# Altium footprint library B-NT_CONNECT.PcbLib: 109 footprints (part 2 of 7)
Each footprint in its own frame and in the unit in brackets; x right, y up, seen from the top. Pads: shape width x height; smd on the part's side, far side on the other; paste and mask are expansions set on the pad; w line width, h text height; cw(c..) or ccw(c..) is an arc to the next point about the centre after c.
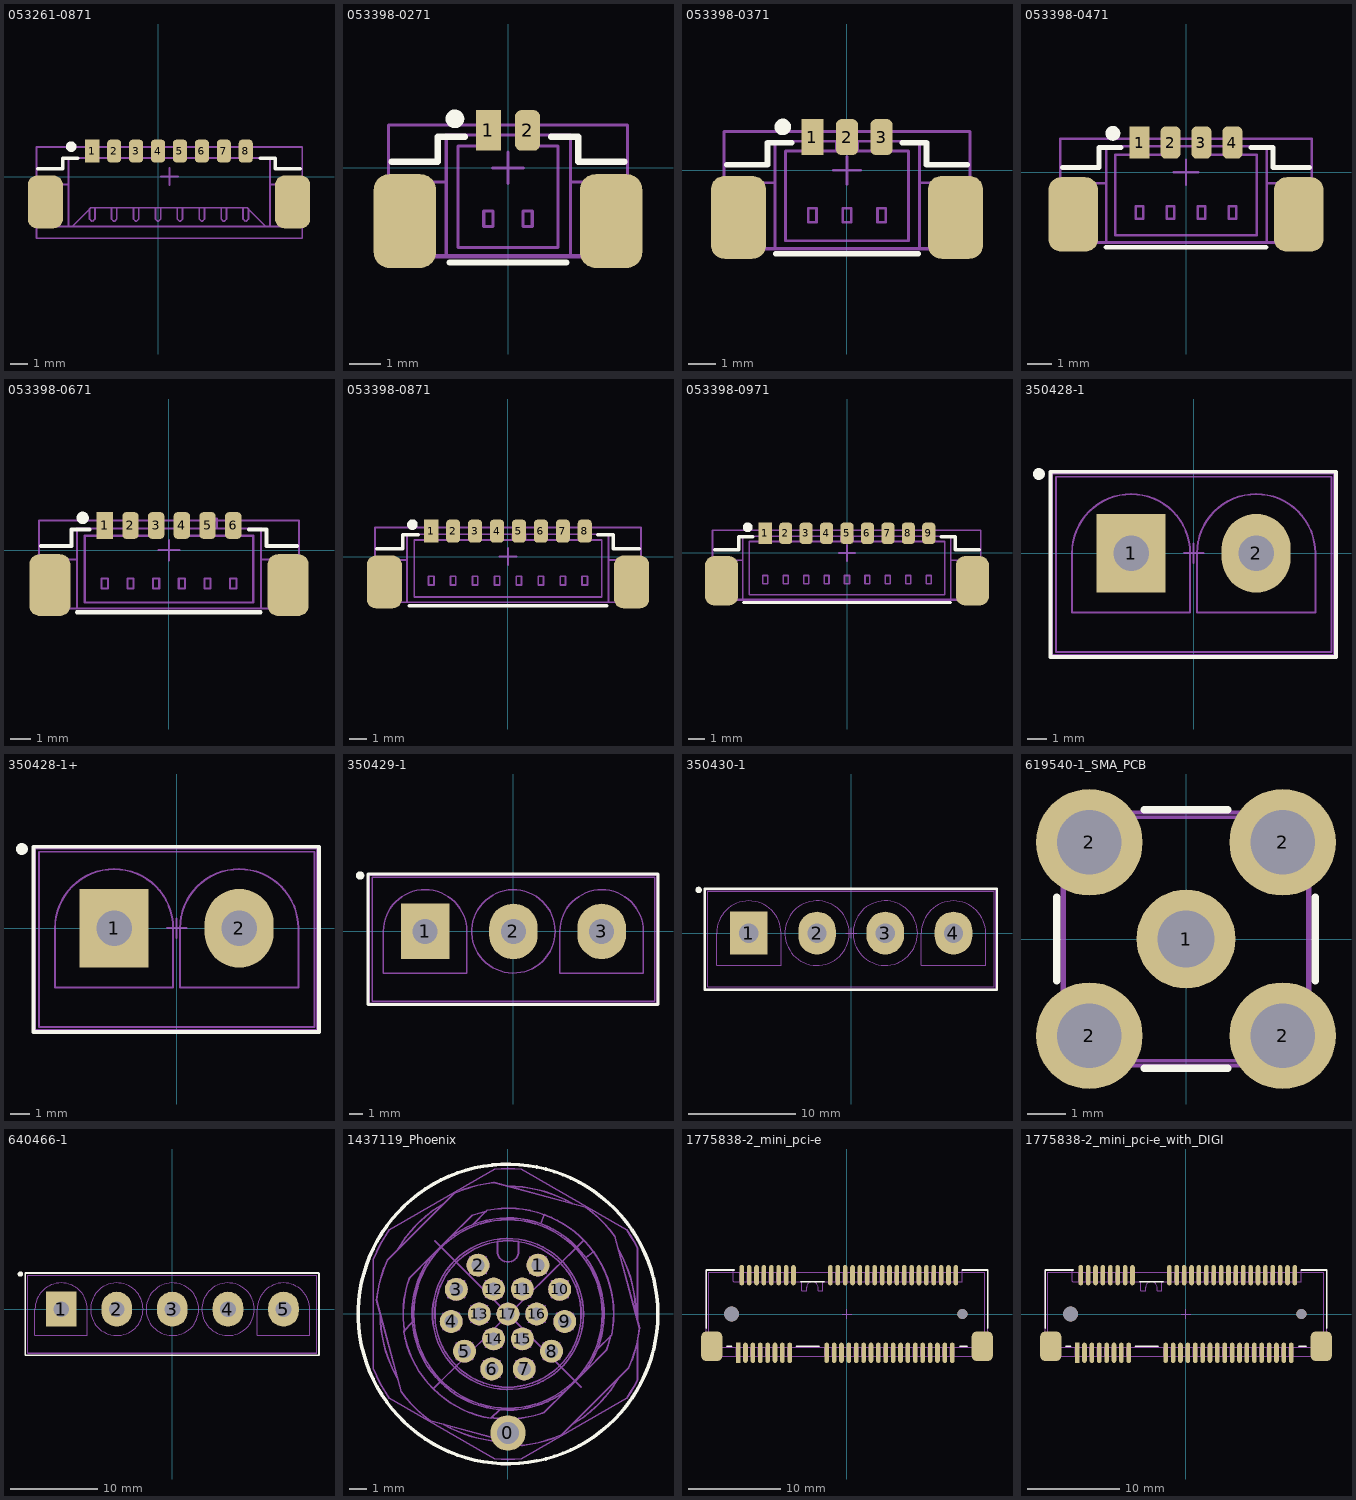
[diagram p1: the footprints below, top view; thin cyan lines are the x and y axes]

## 053261-0871 [mm]
pads (10):
  rect 0.8x1.3 smd: 1(-3.75,1.45)
  rrect50% 0.8x1.3 smd: 2(-2.5,1.45) 3(-1.25,1.45) 4(0,1.45) 5(1.25,1.45) 6(2.5,1.45) 7(3.75,1.45) 8(5,1.45)
  rrect50% 2x3 smd: ""(-6.425,-1.45) ""(7.675,-1.45)
Top Overlay:
  circle w0.3: c-4.95,1.7 r0.15
  lines w0.2: -6.85,0.45 -5.425,0.45 -5.425,1.05 -4.575,1.05 ; 5.825,1.05 6.675,1.05 6.675,0.45 8.1,0.45
M3 Top Assy:
  lines w0.1: -5.1,-0.45 -6.6,-0.45 -6.6,-2.85 ; -4.9,-2.85 -3.9,-1.85 ; -3.9,1.05 -3.9,1.55 -3.6,1.55 -3.6,1.05 ; -3.775,-2.55 -3.9,-2.425 ; -3.725,-2.55 -3.6,-2.425 -3.6,-1.775 ; -2.65,-1.775 -2.65,-2.425 ; -2.65,1.05 -2.65,1.55 -2.35,1.55 -2.35,1.05 ; -2.525,-2.55 -2.65,-2.425 ; -2.475,-2.55 -2.35,-2.425 -2.35,-1.775 ; -1.4,-1.775 -1.4,-2.425 ; -1.4,1.05 -1.4,1.55 -1.1,1.55 -1.1,1.05 ; -1.275,-2.55 -1.4,-2.425 ; -1.225,-2.55 -1.1,-2.425 -1.1,-1.775 ; -0.15,-1.775 -0.15,-2.425 ; -0.15,1.05 -0.15,1.55 0.15,1.55 0.15,1.05 ; -0.025,-2.55 -0.15,-2.425 ; 0.025,-2.55 0.15,-2.425 0.15,-1.775 ; 1.1,-1.775 1.1,-2.425 ; 1.1,1.05 1.1,1.55 1.4,1.55 1.4,1.05 ; 1.225,-2.55 1.1,-2.425 ; 1.275,-2.55 1.4,-2.425 1.4,-1.775 ; 2.35,-1.775 2.35,-2.425 ; 2.475,-2.55 2.35,-2.425 ; 2.525,-2.55 2.65,-2.425 2.65,-1.775 ; 3.6,-1.775 3.6,-2.425 ; 3.725,-2.55 3.6,-2.425 ; 3.775,-2.55 3.9,-2.425 3.9,-1.775 ; 4.85,-1.775 4.85,-2.425 ; 4.975,-2.55 4.85,-2.425 ; 5.025,-2.55 5.15,-2.425 5.15,-1.85 ; 6.15,-2.85 5.15,-1.85 ; 6.375,-0.45 7.8,-0.45 7.8,-2.85 6.35,-2.85 ; -6.6,-2.85 1.35,-2.85 6.35,-2.85 ; -6.6,-2.85 -5.1,-2.85 -5.1,1.05 6.375,1.05 6.375,-2.825 6.35,-2.85 ; -3.9,-2.425 -3.9,-2.425 ; -3.9,-2.425 -3.9,-1.85 ; -3.9,-1.85 -3.825,-1.775 0.075,-1.775 5.075,-1.775 5.15,-1.85 ; -3.9,-1.85 -3.9,-1.85 ; -2.65,-2.425 -2.65,-2.425 ; -1.4,-2.425 -1.4,-2.425 ; -0.15,-2.425 -0.15,-2.425 ; 1.1,-2.425 1.1,-2.425 ; 2.35,-2.425 2.35,-2.425 ; 2.35,1.55 2.35,1.05 2.35,1.55 ; 2.35,1.55 2.65,1.55 ; 2.35,1.55 2.65,1.55 ; 2.65,1.55 2.65,1.05 2.65,1.55 ; 3.6,-2.425 3.6,-2.425 ; 3.6,1.55 3.6,1.05 3.6,1.55 ; 3.6,1.55 3.9,1.55 ; 3.6,1.55 3.9,1.55 ; 3.9,1.55 3.9,1.05 3.9,1.55 ; 4.85,-2.425 4.85,-2.425 ; 4.85,1.55 4.85,1.05 4.85,1.55 ; 4.85,1.55 5.15,1.55 ; 4.85,1.55 5.15,1.55 ; 5.15,1.55 5.15,1.05 5.15,1.55
M8 Top Brd Anno:
  lines w0.1: 0.15,0 1.15,0 ; 0.65,-0.5 0.65,0.5 ; -6.925,-3.525 -6.925,1.675 8.225,1.675 8.225,-3.525 -6.925,-3.525
3D body "532610871.stp": height 3.4, standoff 0, extent -6.925,-3.525 8.225,1.675

## 053398-0271 [mm]
pads (4):
  rect 0.8x1.3 smd: 1(-0.625,1.2)
  rrect50% 0.8x1.3 smd: 2(0.625,1.2)
  rrect50% 2x3 smd: ""(-3.3,-1.7) ""(3.3,-1.7)
Top Overlay:
  circle w0.3: c-1.7,1.57 r0.15
  lines w0.2: -3.725,0.2 -2.25,0.2 -2.25,1 -1.375,1 ; -1.875,-3.025 0,-3.025 1.875,-3.025 ; 1.375,1 2.25,1 2.25,0.2 3.725,0.2
M3 Top Assy:
  lines w0.1: -2,-2.85 1.975,-2.85 ; -1.975,-0.45 -3.475,-0.45 -3.475,-2.85 -1.975,-2.85 -1.975,1.05 2,1.05 2,-2.825 1.975,-2.85 ; -0.375,1.05 -0.375,0.7 -1.6,0.7 -1.6,-2.55 1.6,-2.55 1.6,0.7 0.375,0.7 0.375,1.05 ; 2,-0.45 3.425,-0.45 3.425,-2.85 1.975,-2.85 ; -0.775,1.55 -0.475,1.55 ; -0.775,1.55 -0.775,1.05 -0.775,1.55 ; -0.775,1.55 -0.475,1.55 ; -0.475,1.55 -0.475,1.05 -0.475,1.55 ; 0.475,1.55 0.775,1.55 ; 0.475,1.55 0.475,1.05 0.475,1.55 ; 0.475,1.55 0.775,1.55 ; 0.775,1.55 0.775,1.05 0.775,1.55 ; -0.775,-1.875 -0.775,-1.375 -0.475,-1.375 -0.475,-1.875 -0.775,-1.875 ; 0.475,-1.875 0.775,-1.875 0.775,-1.375 0.475,-1.375 0.475,-1.875
M8 Top Brd Anno:
  lines w0.1: -0.5,0 0.5,0 ; 0,-0.5 0,0.5 ; -3.825,-2.8 -3.825,1.375 3.825,1.375 3.825,-2.8 -3.825,-2.8
3D body "0271.STEP": height 4.72, standoff -0.02, extent -3.825,-2.825 3.825,1.375

## 053398-0371 [mm]
pads (5):
  rect 0.8x1.3 smd: 1(-1.25,1.2)
  rrect50% 0.8x1.3 smd: 2(0,1.2) 3(1.25,1.2)
  rrect50% 2x3 smd: ""(-3.925,-1.7) ""(3.925,-1.7)
Top Overlay:
  circle w0.3: c-2.325,1.57 r0.15
  lines w0.2: -4.35,0.2 -2.875,0.2 -2.875,1 -2,1 ; -2.575,-3.025 2.575,-3.025 ; 2,1 2.875,1 2.875,0.2 4.35,0.2
M3 Top Assy:
  lines w0.1: -2.6,-0.45 -4.1,-0.45 -4.1,-2.85 ; -1.4,1.05 -1.4,1.55 -1.1,1.55 -1.1,1.05 ; -0.375,1.05 -0.375,0.7 -2.225,0.7 -2.225,-2.55 2.225,-2.55 2.225,0.7 0.375,0.7 0.375,1.05 ; -0.15,1.05 -0.15,1.55 0.15,1.55 0.15,1.05 ; 2.625,-0.45 4.05,-0.45 4.05,-2.85 2.6,-2.85 2.625,-2.825 2.625,1.05 -2.6,1.05 -2.6,-2.85 -4.1,-2.85 ; 3.85,-2.85 -4.1,-2.85 ; 1.1,1.05 1.1,1.55 ; 1.1,1.05 1.1,1.55 ; 1.1,1.05 1.1,1.55 ; 1.1,1.55 1.4,1.55 ; 1.1,1.55 1.4,1.55 ; 1.1,1.55 1.4,1.55 ; 1.4,1.05 1.4,1.55 ; 1.4,1.05 1.4,1.55 ; 1.4,1.05 1.4,1.55 ; -1.4,-1.875 -1.4,-1.375 -1.1,-1.375 -1.1,-1.875 -1.4,-1.875 ; -0.15,-1.875 -0.15,-1.375 0.15,-1.375 0.15,-1.875 -0.15,-1.875 ; 1.1,-1.875 1.1,-1.375 1.4,-1.375 1.4,-1.875 1.1,-1.875
M8 Top Brd Anno:
  lines w0.1: -0.5,0 0.5,0 ; 0,-0.5 0,0.5 ; -4.45,-2.825 -4.45,1.4 4.45,1.4 4.45,-2.825 -4.45,-2.825
3D body "0371.STEP": height 4.72, standoff -0.02, extent -4.45,-2.8 4.45,1.4

## 053398-0471 [mm]
pads (6):
  rect 0.8x1.3 smd: 1(-1.875,1.2)
  rrect50% 0.8x1.3 smd: 2(-0.625,1.2) 3(0.625,1.2) 4(1.875,1.2)
  rrect50% 2x3 smd: ""(-4.55,-1.7) ""(4.55,-1.7)
Top Overlay:
  circle w0.3: c-2.95,1.57 r0.15
  lines w0.2: -4.975,0.2 -3.5,0.2 -3.5,1 -2.625,1 ; -3.225,-3.025 3.225,-3.025 ; 2.625,1 3.5,1 3.5,0.2 4.975,0.2
M3 Top Assy:
  lines w0.1: -3.225,-0.45 -4.725,-0.45 -4.725,-2.85 ; -2.025,1.05 -2.025,1.55 -1.725,1.55 -1.725,1.05 ; -0.775,1.05 -0.775,1.55 -0.475,1.55 -0.475,1.05 ; -0.375,1.05 -0.375,0.7 -2.85,0.7 -2.85,-2.55 2.85,-2.55 2.85,0.7 0.375,0.7 0.375,1.05 ; 3.25,-0.45 4.675,-0.45 4.675,-2.85 3.225,-2.85 ; -4.725,-2.85 3.225,-2.85 ; -4.725,-2.85 -3.225,-2.85 -3.225,1.05 3.25,1.05 3.25,-2.825 3.225,-2.85 ; 0.475,1.55 0.475,1.05 0.475,1.55 ; 0.475,1.55 0.775,1.55 ; 0.475,1.55 0.775,1.55 ; 0.775,1.55 0.775,1.05 0.775,1.55 ; 1.725,1.55 1.725,1.05 1.725,1.55 ; 1.725,1.55 2.025,1.55 ; 1.725,1.55 2.025,1.55 ; 2.025,1.55 2.025,1.05 2.025,1.55 ; -2.025,-1.875 -1.725,-1.875 -1.725,-1.375 -2.025,-1.375 -2.025,-1.875 ; -0.775,-1.875 -0.775,-1.375 -0.475,-1.375 -0.475,-1.875 -0.775,-1.875 ; 0.475,-1.875 0.775,-1.875 0.775,-1.375 0.475,-1.375 0.475,-1.875 ; 1.725,-1.875 1.725,-1.375 2.025,-1.375 2.025,-1.875 1.725,-1.875
M8 Top Brd Anno:
  lines w0.1: -0.5,0 0.5,0 ; 0,-0.5 0,0.5 ; -5.075,-2.825 -5.075,1.35 5.075,1.35 5.075,-2.825 -5.075,-2.825
3D body "04712.STEP": height 4.72, standoff -0.02, extent -5.075,-2.85 5.075,1.35

## 053398-0671 [mm]
pads (8):
  rect 0.8x1.3 smd: 1(-3.125,1.2)
  rrect50% 0.8x1.3 smd: 2(-1.875,1.2) 3(-0.625,1.2) 4(0.625,1.2) 5(1.875,1.2) 6(3.125,1.2)
  rrect50% 2x3 smd: ""(-5.8,-1.7) ""(5.8,-1.7)
Top Overlay:
  circle w0.3: c-4.2,1.57 r0.15
  lines w0.2: -6.225,0.2 -4.75,0.2 -4.75,1 -3.875,1 ; -4.475,-3.025 4.45,-3.025 ; 3.9,1 4.75,1 4.75,0.2 6.225,0.2
M3 Top Assy:
  lines w0.1: -4.475,-0.45 -5.975,-0.45 -5.975,-2.85 -4.475,-2.85 ; -3.275,1.05 -3.275,1.55 -2.975,1.55 -2.975,1.05 ; -2.025,1.05 -2.025,1.55 -1.725,1.55 -1.725,1.05 ; -0.375,1.05 -0.375,0.7 -4.1,0.7 -4.1,-2.55 4.1,-2.55 4.1,0.7 0.375,0.7 0.375,1.05 ; 2.95,1.05 -0.775,1.05 ; 3.275,1.05 3.275,1.55 2.975,1.55 2.975,1.05 4.475,1.05 4.475,-2.85 ; 4.475,-0.45 5.975,-0.45 5.975,-2.85 4.475,-2.85 ; -4.475,-2.85 4.475,-2.85 ; -4.475,-2.85 -4.475,1.05 -0.775,1.05 ; -0.775,1.05 -0.775,1.55 ; -0.775,1.05 -0.775,1.55 ; -0.775,1.55 -0.475,1.55 ; -0.775,1.55 -0.475,1.55 ; -0.475,1.55 -0.475,1.05 -0.475,1.55 ; 0.475,1.55 0.475,1.05 0.475,1.55 ; 0.475,1.55 0.775,1.55 ; 0.475,1.55 0.775,1.55 ; 0.775,1.55 0.775,1.05 0.775,1.55 ; 2.025,1.55 2.025,1.05 2.025,1.55 ; 2.025,1.55 2.325,1.55 ; 2.025,1.55 2.325,1.55 ; 2.325,1.55 2.325,1.05 2.325,1.55 ; -3.275,-1.875 -2.975,-1.875 -2.975,-1.375 -3.275,-1.375 -3.275,-1.875 ; -2.025,-1.875 -2.025,-1.375 -1.725,-1.375 -1.725,-1.875 -2.025,-1.875 ; -0.775,-1.875 -0.475,-1.875 -0.475,-1.375 -0.775,-1.375 -0.775,-1.875 ; 0.475,-1.875 0.475,-1.375 0.775,-1.375 0.775,-1.875 0.475,-1.875 ; 1.725,-1.875 1.725,-1.375 2.025,-1.375 2.025,-1.875 1.725,-1.875 ; 2.975,-1.875 3.275,-1.875 3.275,-1.375 2.975,-1.375 2.975,-1.875
M8 Top Brd Anno:
  lines w0.1: -0.5,0 0.5,0 ; 0,-0.5 0,0.5 ; -6.325,-2.85 6.325,-2.85 6.325,1.45 -6.325,1.45 -6.325,-2.675 -6.325,-2.85
3D body "0671.STEP": height 4.72, standoff -0.02, extent -6.325,-2.75 6.325,1.45

## 053398-0871 [mm] "CONN HEADER 8POS 1.25MM VERT SMD"
height 4.7
pads (10):
  rect 0.8x1.3 smd: 1(-4.375,1.45)
  rrect50% 0.8x1.3 smd: 2(-3.125,1.45) 3(-1.875,1.45) 4(-0.625,1.45) 5(0.625,1.45) 6(1.875,1.45) 7(3.125,1.45) 8(4.375,1.45)
  rrect50% 2x3 smd: ""(-7.05,-1.45) ""(7.05,-1.45)
Top Overlay:
  circle w0.3: c-5.45,1.82 r0.15
  lines w0.2: -7.475,0.45 -6,0.45 -6,1.25 -5.125,1.25 ; -5.625,-2.8 5.625,-2.8 ; 5.125,1.25 6,1.25 6,0.45 7.475,0.45
M3 Top Assy:
  lines w0.1: -5.775,1.275 5.725,1.275 5.725,-2.6 7.225,-2.6 7.225,-0.2 5.725,-0.2 ; -5.75,-0.2 -7.25,-0.2 -7.25,-2.6 -5.75,-2.6 ; -5.75,1.275 -5.75,-2.6 ; -4.525,1.275 -4.525,1.775 -4.225,1.775 -4.225,1.275 ; -4.525,1.3 -4.525,1.8 -4.225,1.8 -4.225,1.3 ; -3.275,1.275 -3.275,1.775 -2.975,1.775 -2.975,1.275 ; -3.275,1.3 -3.275,1.8 -2.975,1.8 -2.975,1.3 ; -2.025,1.275 -2.025,1.775 -1.725,1.775 -1.725,1.275 ; -1.6,-2.3 5.35,-2.3 5.35,0.95 1,0.95 1,1.275 ; -0.775,1.275 -0.775,1.775 -0.475,1.775 -0.475,1.275 ; 0.25,1.275 0.25,0.95 -5.35,0.95 -5.35,-2.3 2.85,-2.3 ; 0.475,1.275 0.475,1.775 0.775,1.775 0.775,1.275 ; 1.725,1.275 1.725,1.775 2.025,1.775 2.025,1.275 ; 2.975,1.275 2.975,1.775 3.275,1.775 3.275,1.3 ; 4.225,1.3 4.225,1.8 4.525,1.8 4.525,1.3 ; 6.975,-2.6 -5.75,-2.6 ; -2.025,1.8 -2.025,1.3 -2.025,1.8 ; -2.025,1.8 -1.725,1.8 ; -2.025,1.8 -1.725,1.8 ; -1.725,1.8 -1.725,1.3 -1.725,1.8 ; -0.775,1.8 -0.775,1.3 -0.775,1.8 ; -0.775,1.8 -0.475,1.8 ; -0.775,1.8 -0.475,1.8 ; -0.475,1.8 -0.475,1.3 -0.475,1.8 ; 1.725,1.8 2.025,1.8 ; 1.725,1.8 1.725,1.3 1.725,1.8 ; 1.725,1.8 2.025,1.8 ; 2.025,1.8 2.025,1.3 2.025,1.8 ; 2.975,1.8 3.275,1.8 ; 2.975,1.8 2.975,1.3 2.975,1.8 ; 2.975,1.8 3.275,1.8 ; 3.275,1.3 3.275,1.8 ; 3.275,1.3 3.275,1.8 ; 4.225,1.775 4.525,1.775 ; 4.225,1.775 4.225,1.275 4.225,1.775 ; 4.225,1.775 4.525,1.775 ; 4.525,1.775 4.525,1.275 4.525,1.775 ; -4.525,-1.625 -4.225,-1.625 -4.225,-1.125 -4.525,-1.125 -4.525,-1.625 ; -3.275,-1.625 -3.275,-1.125 -2.975,-1.125 -2.975,-1.625 -3.275,-1.625 ; -2.025,-1.625 -1.725,-1.625 -1.725,-1.125 -2.025,-1.125 -2.025,-1.625 ; -0.775,-1.625 -0.775,-1.125 -0.475,-1.125 -0.475,-1.625 -0.775,-1.625 ; 0.475,-1.625 0.775,-1.625 0.775,-1.125 0.475,-1.125 0.475,-1.625 ; 1.725,-1.625 1.725,-1.125 2.025,-1.125 2.025,-1.625 1.725,-1.625 ; 2.975,-1.625 3.275,-1.625 3.275,-1.125 2.975,-1.125 2.975,-1.625 ; 4.225,-1.625 4.225,-1.125 4.525,-1.125 4.525,-1.625 4.225,-1.625
M8 Top Brd Anno:
  lines w0.1: -0.5,0 0.5,0 ; 0,-0.5 0,0.5 ; -7.575,-2.6 -7.575,1.65 7.575,1.65 7.575,-2.6 -7.575,-2.6
3D body "533980871.stp": height 4.67, standoff -0.07, extent -7.575,-2.55 7.575,1.65

## 053398-0971 [mm]
pads (11):
  rect 0.8x1.3 smd: 1(-5,1.2)
  rrect50% 0.8x1.3 smd: 2(-3.75,1.2) 3(-2.5,1.2) 4(-1.25,1.2) 5(0,1.2) 6(1.25,1.2) 7(2.5,1.2) 8(3.75,1.2) 9(5,1.2)
  rrect50% 2x3 smd: ""(-7.675,-1.7) ""(7.675,-1.7)
Top Overlay:
  circle w0.3: c-6.075,1.57 r0.15
  lines w0.2: -8.1,0.2 -6.625,0.2 -6.625,1 -5.75,1 ; -6.325,-3.025 6.325,-3.025 ; 5.75,1 6.625,1 6.625,0.2 8.1,0.2
M3 Top Assy:
  lines w0.1: -6.375,-0.45 -7.875,-0.45 -7.875,-2.85 -6.375,-2.85 ; -5.15,1.025 -5.15,1.525 -4.85,1.525 -4.85,1.025 ; -5.15,1.05 -5.15,1.55 -4.85,1.55 -4.85,1.05 ; -3.9,1.025 -3.9,1.525 -3.6,1.525 -3.6,1.025 ; -3.9,1.05 -3.9,1.55 -3.6,1.55 -3.6,1.05 ; -2.65,1.025 -2.65,1.525 -2.35,1.525 -2.35,1.025 ; -2.225,-2.55 5.975,-2.55 5.975,0.7 0.375,0.7 0.375,1.025 ; -1.4,1.025 -1.4,1.525 -1.1,1.525 -1.1,1.025 ; -0.375,1.025 -0.375,0.7 -5.975,0.7 -5.975,-2.55 2.225,-2.55 ; -0.15,1.025 -0.15,1.525 0.15,1.525 0.15,1.025 ; 1.1,1.025 1.1,1.525 1.4,1.525 1.4,1.025 ; 2.35,1.025 2.35,1.525 2.65,1.525 2.65,1.05 ; 3.6,1.025 3.6,1.525 3.9,1.525 3.9,1.025 ; 3.6,1.05 3.6,1.55 3.9,1.55 3.9,1.05 ; 4.85,1.025 4.85,1.525 5.15,1.525 5.15,1.025 ; 4.85,1.05 4.85,1.55 5.15,1.55 5.15,1.05 ; 6.35,-0.45 7.85,-0.45 7.85,-2.85 6.35,-2.85 ; -6.375,-2.85 6.35,-2.85 ; -6.375,-2.85 -6.375,1.025 6.35,1.025 6.35,-2.85 ; -2.65,1.55 -2.65,1.05 -2.65,1.55 ; -2.65,1.55 -2.35,1.55 ; -2.65,1.55 -2.35,1.55 ; -2.35,1.55 -2.35,1.05 -2.35,1.55 ; -1.4,1.55 -1.4,1.05 -1.4,1.55 ; -1.4,1.55 -1.1,1.55 ; -1.4,1.55 -1.1,1.55 ; -1.1,1.55 -1.1,1.05 -1.1,1.55 ; 1.1,1.55 1.4,1.55 ; 1.1,1.55 1.1,1.05 1.1,1.55 ; 1.1,1.55 1.4,1.55 ; 1.4,1.55 1.4,1.05 1.4,1.55 ; 2.35,1.55 2.65,1.55 ; 2.35,1.55 2.35,1.05 2.35,1.55 ; 2.35,1.55 2.65,1.55 ; 2.65,1.05 2.65,1.55 ; 2.65,1.05 2.65,1.55 ; -5.15,-1.875 -4.85,-1.875 -4.85,-1.375 -5.15,-1.375 -5.15,-1.875 ; -3.9,-1.875 -3.9,-1.375 -3.6,-1.375 -3.6,-1.875 -3.9,-1.875 ; -2.65,-1.875 -2.35,-1.875 -2.35,-1.375 -2.65,-1.375 -2.65,-1.875 ; -1.4,-1.875 -1.4,-1.375 -1.1,-1.375 -1.1,-1.875 -1.4,-1.875 ; -0.15,-1.875 0.15,-1.875 0.15,-1.375 -0.15,-1.375 -0.15,-1.875 ; 1.1,-1.875 1.1,-1.375 1.4,-1.375 1.4,-1.875 1.1,-1.875 ; 2.35,-1.875 2.65,-1.875 2.65,-1.375 2.35,-1.375 2.35,-1.875 ; 3.6,-1.875 3.6,-1.375 3.9,-1.375 3.9,-1.875 3.6,-1.875 ; 4.85,-1.875 5.15,-1.875 5.15,-1.375 4.85,-1.375 4.85,-1.875
M8 Top Brd Anno:
  lines w0.1: -0.5,0 0.5,0 ; 0,-0.5 0,0.5 ; -8.225,-2.875 -8.225,1.4 8.175,1.4 8.175,-2.875 -8.225,-2.875
3D body "0971.STEP": height 4.67, standoff -0.07, extent -8.225,-2.8 8.175,1.4

## 350428-1 [mm]
pads (2):
  rect 3.5x4 hole 1.8: 1(-3.175,0)
  oval 3.5x4 hole 1.8: 2(3.175,0)
Top Overlay:
  circle w0.3: c-7.85,4.02 r0.15
  lines w0.2: -7.275,-5.265 7.225,-5.265 7.225,4.135 -7.275,4.135 -7.275,-5.265
M3 Top Assy:
  lines w0.1: -6.985,-5.01 6.985,-5.01 6.985,3.88 -6.985,3.88 -6.985,-5.01 ; -6.175,-3 -6.175,0 cw(c-3.175,0) -0.175,0 -0.175,-3 -6.175,-3 ; -4.115,-0.93 -4.115,0.92 -2.265,0.92 -2.265,-0.93 -4.115,-0.93 ; -3.415,-0.25 -3.415,0.25 -2.915,0.25 -2.915,-0.25 -3.415,-0.25 ; 0.175,-3 0.175,0 cw(c3.175,0) 6.175,0 6.175,-3 0.175,-3 ; 2.235,-0.93 4.085,-0.93 4.085,0.92 2.235,0.92 2.235,-0.93 ; 2.935,-0.25 3.435,-0.25 3.435,0.25 2.935,0.25 2.935,-0.25
M8 Top Brd Anno:
  lines w0.1: -0.5,0 0.5,0 ; 0,-0.5 0,0.5 ; -7.175,-5.175 7.125,-5.175 7.125,4.05 -7.175,4.05 -7.175,-5.175
3D body "350428-1.STEP": height 14.77, standoff -3.58, extent -9.531,-5.01 9.531,3.81

## 350428-1+ [mm]
pads (2):
  rect 3.5x4 hole 1.8: 1(-3.175,0)
  oval 3.5x4 hole 1.8: 2(3.175,0)
Top Overlay:
  circle w0.3: c-7.85,4.02 r0.15
  lines w0.2: -7.275,-5.265 -7.275,4.135 7.225,4.135 7.225,-5.265 -7.275,-5.265
M3 Top Assy:
  lines w0.1: -6.985,-5.01 -6.985,3.88 6.985,3.88 6.985,-5.01 -6.985,-5.01 ; -6.175,-3 -6.175,0 cw(c-3.175,0) -0.175,0 -0.175,-3 -6.175,-3 ; -4.115,-0.93 -2.265,-0.93 -2.265,0.92 -4.115,0.92 -4.115,-0.93 ; -3.415,-0.25 -2.915,-0.25 -2.915,0.25 -3.415,0.25 -3.415,-0.25 ; 0.175,-3 0.175,0 cw(c3.175,0) 6.175,0 6.175,-3 0.175,-3 ; 2.235,-0.93 2.235,0.92 4.085,0.92 4.085,-0.93 2.235,-0.93 ; 2.935,-0.25 2.935,0.25 3.435,0.25 3.435,-0.25 2.935,-0.25
M8 Top Brd Anno:
  lines w0.1: -0.5,0 0.5,0 ; 0,-0.5 0,0.5 ; -7.175,-5.175 7.125,-5.175 7.125,4.05 -7.175,4.05 -7.175,-5.175
3D body "ответка350428-1.STEP": height 30.75, standoff 3, extent -12,-7.5 12,7.5
3D body "350428-1.STEP": height 14.77, standoff -3.58, extent -9.531,-5.01 9.531,3.81

## 350429-1 [mm]
pads (3):
  rect 3.5x4 hole 1.8: 1(-6.35,0)
  oval 3.5x4 hole 1.8: 2(0,0) 3(6.35,0)
Top Overlay:
  circle w0.3: c-11.025,4.02 r0.15
  lines w0.2: 10.391,-5.265 -10.45,-5.265 -10.45,4.135 10.382,4.135 10.4,4.117 10.4,-5.265
M3 Top Assy:
  circle w0.1: c0,0 r3
  lines w0.1: -10.16,-5.01 10.16,-5.01 10.16,3.88 -10.16,3.88 -10.16,-5.01 ; -9.35,-3 -3.35,-3 -3.35,0 ccw(c-6.35,0) -9.35,0 -9.35,-3 ; -7.29,-0.93 -7.29,0.92 -5.44,0.92 -5.44,-0.93 -7.29,-0.93 ; -6.59,-0.25 -6.59,0.25 -6.09,0.25 -6.09,-0.25 -6.59,-0.25 ; -0.94,-0.93 0.91,-0.93 0.91,0.92 -0.94,0.92 -0.94,-0.93 ; -0.24,-0.25 0.26,-0.25 0.26,0.25 -0.24,0.25 -0.24,-0.25 ; 3.35,-3 3.35,0 cw(c6.35,0) 9.35,0 9.35,-3 3.35,-3 ; 5.41,-0.93 5.41,0.92 7.26,0.92 7.26,-0.93 5.41,-0.93 ; 6.11,-0.25 6.11,0.25 6.61,0.25 6.61,-0.25 6.11,-0.25
M8 Top Brd Anno:
  lines w0.1: -10.35,-5.175 10.3,-5.175 10.3,4.05 -10.35,4.05 -10.35,-5.175
3D body "350429-1.STEP": height 14.77, standoff -3.58, extent -12.706,-5.01 12.706,3.81

## 350430-1 [mm]
pads (4):
  rect 3.5x4 hole 1.8: 1(-9.525,0)
  oval 3.5x4 hole 1.8: 2(-3.175,0) 3(3.175,0) 4(9.525,0)
Top Overlay:
  circle w0.3: c-14.2,4.02 r0.15
  lines w0.2: 13.557,4.135 13.575,4.117 13.575,-5.265 -13.625,-5.265 -13.625,4.135 13.575,4.135
M3 Top Assy:
  circle w0.1: c3.175,0 r3
  circle w0.1: c-3.175,0 r3
  lines w0.1: -13.335,-5.01 -13.335,3.88 13.335,3.88 13.335,-5.01 -13.335,-5.01 ; -12.525,-3 -6.525,-3 -6.525,0 ccw(c-9.525,0) -12.525,0 -12.525,-3 ; -10.465,-0.93 -8.615,-0.93 -8.615,0.92 -10.465,0.92 -10.465,-0.93 ; -9.765,-0.25 -9.265,-0.25 -9.265,0.25 -9.765,0.25 -9.765,-0.25 ; -4.115,-0.93 -4.115,0.92 -2.265,0.92 -2.265,-0.93 -4.115,-0.93 ; -3.415,-0.25 -3.415,0.25 -2.915,0.25 -2.915,-0.25 -3.415,-0.25 ; 2.235,-0.93 4.085,-0.93 4.085,0.92 2.235,0.92 2.235,-0.93 ; 2.935,-0.25 3.435,-0.25 3.435,0.25 2.935,0.25 2.935,-0.25 ; 6.525,-3 12.525,-3 12.525,0 ccw(c9.525,0) 6.525,0 6.525,-3 ; 8.585,-0.93 8.585,0.92 10.435,0.92 10.435,-0.93 8.585,-0.93 ; 9.285,-0.25 9.285,0.25 9.785,0.25 9.785,-0.25 9.285,-0.25
M8 Top Brd Anno:
  lines w0.1: -0.5,0 0.5,0 ; 0,-0.5 0,0.5 ; -13.525,-5.175 13.475,-5.175 13.475,4.05 -13.525,4.05 -13.525,-5.175
3D body "350430-1.STEP": height 14.77, standoff -3.58, extent -15.893,-4.94 15.894,3.88

## 619540-1_SMA_PCB [mm] "SMA CONN PCB TE 619540-1"
height 9.6
pads (5):
  round 2.6 hole 1.5: 1(0,0)
  round 2.8 hole 1.7: 2(-2.54,-2.54) 2(-2.54,2.54) 2(2.54,-2.54) 2(2.54,2.54)
Top Overlay:
  lines w0.2: -3.4,-1.1 -3.4,1.1 ; -1.1,-3.4 1.1,-3.4 ; -1.1,3.4 1.1,3.4 ; 3.4,-1.1 3.4,1.1
M3 Top Assy:
  lines w0.1: -3.2,-3.2 -3.2,3.2 3.2,3.2 3.2,-3.2 -3.2,-3.2
M8 Top Brd Anno:
  lines w0.1: -0.5,0 0.5,0 ; 0,-0.5 0,0.5 ; -3.25,-3.325 3.25,-3.325 3.25,3.325 -3.25,3.325 -3.25,-3.325
3D body "c-619540-1-a-3d.stp": height 9.6, standoff -3.9, extent -3.2,-15.8 3.2,3.2

## 640466-1 [mm]
pads (5):
  rect 3.5x4 hole 1.8: 1(-12.7,0)
  oval 3.5x4 hole 1.8: 2(-6.35,0) 3(0,0) 4(6.35,0) 5(12.7,0)
Top Overlay:
  circle w0.3: c-17.375,4.02 r0.15
  lines w0.2: 16.7,4.135 -16.8,4.135 -16.8,-5.265 16.735,-5.265 16.75,-5.25 16.75,4.117 16.732,4.135
M3 Top Assy:
  circle w0.1: c6.35,0 r3
  circle w0.1: c0,0 r3
  circle w0.1: c-6.35,0 r3
  lines w0.1: -16.51,-5.01 -16.51,3.88 16.51,3.88 16.51,-5.01 -16.51,-5.01 ; -15.7,-3 -15.7,0 cw(c-12.7,0) -9.7,0 -9.7,-3 -15.7,-3 ; -13.64,-0.93 -11.79,-0.93 -11.79,0.92 -13.64,0.92 -13.64,-0.93 ; -12.94,-0.25 -12.44,-0.25 -12.44,0.25 -12.94,0.25 -12.94,-0.25 ; -7.29,-0.93 -7.29,0.92 -5.44,0.92 -5.44,-0.93 -7.29,-0.93 ; -6.59,-0.25 -6.59,0.25 -6.09,0.25 -6.09,-0.25 -6.59,-0.25 ; -0.94,-0.93 0.91,-0.93 0.91,0.92 -0.94,0.92 -0.94,-0.93 ; -0.24,-0.25 0.26,-0.25 0.26,0.25 -0.24,0.25 -0.24,-0.25 ; 5.41,-0.93 5.41,0.92 7.26,0.92 7.26,-0.93 5.41,-0.93 ; 6.11,-0.25 6.11,0.25 6.61,0.25 6.61,-0.25 6.11,-0.25 ; 9.7,-3 15.7,-3 15.7,0 ccw(c12.7,0) 9.7,0 9.7,-3 ; 11.76,-0.93 13.61,-0.93 13.61,0.92 11.76,0.92 11.76,-0.93 ; 12.46,-0.25 12.96,-0.25 12.96,0.25 12.46,0.25 12.46,-0.25
M8 Top Brd Anno:
  lines w0.1: -0.5,0 0.5,0 ; 0,-0.5 0,0.5 ; -16.51,-5 -16.51,3.875 16.51,3.875 16.51,-5 -16.1,-5 -16.51,-5
3D body "640466-1.STEP": height 14.77, standoff -3.58, extent -19.056,-5.01 19.107,3.81

## 1437119_Phoenix [mm] "CONN PLUG MALE 17POS GOLD SOLDER"
height 22.3
pads (18):
  round 2 hole 1.25: 0(0,-6.75)
  round 1.3 hole 0.75: 1(1.698,2.771) 2(-1.698,2.771) 3(-2.933,1.399) 4(-3.222,-0.424) 5(-2.471,-2.111) 6(-0.923,-3.116) 7(0.923,-3.116) 8(2.472,-2.111) 9(3.222,-0.424) 10(2.933,1.399) 11(0.815,1.412) 12(-0.815,1.412) 13(-1.625,0) 14(-0.815,-1.412) 15(0.815,-1.412) 16(1.625,0) 17(0,0)
Top Overlay:
  circle w0.2: c0,0 r8.5
M3 Top Assy:
  circle w0.1: c-0.002,-0.005 r0.322
  circle w0.1: c-0.923,-3.116 r0.6
  circle w0.1: c-0.815,-1.412 r0.6
  circle w0.1: c0.923,-3.116 r0.6
  circle w0.1: c0.815,-1.412 r0.6
  circle w0.1: c-3.222,-0.424 r0.6
  circle w0.1: c-2.933,1.399 r0.6
  circle w0.1: c-0.815,1.411 r0.6
  circle w0.1: c0.815,1.411 r0.6
  circle w0.1: c3.223,-0.424 r0.6
  circle w0.1: c2.934,1.399 r0.6
  circle w0.1: c1.699,2.771 r0.6
  circle w0.1: c-1.698,2.771 r0.6
  circle w0.1: c2.472,-2.111 r0.6
  circle w0.1: c0,0 r0.6
  circle w0.1: c0,0 r0.315
  circle w0.1: c0,0 r0.322
  circle w0.1: c-1.63,0 r0.6
  circle w0.1: c1.63,0 r0.6
  circle w0.1: c-2.471,-2.111 r0.6
  circle w0.1: c0,0 r4.284
  circle w0.1: c0,0 r5.35
  lines w0.1: -7.25,0.011 ccw(c0,0) -6.273,-3.635 ; -6.284,3.615 cw(c0,0) -3.615,6.284 ; -5.936,0.402 cw(c0.02,-0.002) -5.835,1.159 ; -5.92,-0.971 -5.429,-0.479 ; -5.918,-0.986 ccw(c0,0) -4.243,-4.243 ; -5.872,-0.958 cw(c-0.004,0) -5.835,1.159 ; -5.588,2.042 ccw(c-0.018,0.006) -5.835,1.159 ; -5.584,2.052 -4.339,3.297 ; -4.2,-4.2 4.262,4.161 ; -4.161,4.161 4.162,-4.162 ; -3.688,-0.891 -2.755,0.042 ; -3.688,0.042 -2.755,-0.891 ; -3.634,-6.273 ccw(c0,0) 0.012,-7.25 ; -3.4,0.932 -2.466,1.866 ; -3.4,1.866 -2.466,0.932 ; -2.938,-2.578 -2.004,-1.644 ; -2.938,-1.644 -2.004,-2.578 ; -2.164,2.304 -1.231,3.237 ; -2.164,3.237 -1.231,2.304 ; -2.096,-0.467 -1.163,0.466 ; -2.096,0.466 -1.163,-0.467 ; -2.051,5.585 -3.297,4.339 ; -2.023,5.595 cw(c0,0.001) -1.255,5.816 ; -1.389,-3.583 -0.456,-2.65 ; -1.389,-2.65 -0.456,-3.583 ; -1.281,-1.879 -0.348,-0.945 ; -1.281,-0.945 -0.348,-1.879 ; -1.281,0.945 -0.348,1.878 ; -1.281,1.878 -0.348,0.945 ; -0.927,-5.877 ccw(c0.005,0.02) -0.813,-5.894 ccw(c-0.002,-0.028) -0.003,-5.95 ; -0.011,7.25 cw(c0,0) 3.635,6.273 ; 0.349,-1.879 1.282,-0.945 ; 0.349,-0.945 1.282,-1.879 ; 0.349,0.945 1.282,1.878 ; 0.349,1.878 1.282,0.945 ; 0.457,-3.583 1.39,-2.65 ; 0.457,-2.65 1.39,-3.583 ; 1.164,-0.467 2.097,0.466 ; 1.164,0.466 2.097,-0.467 ; 1.232,2.304 2.165,3.237 ; 1.232,3.237 2.165,2.304 ; 2.005,-2.578 2.938,-1.644 ; 2.005,-1.644 2.938,-2.578 ; 2.041,-5.589 cw(c0.006,-0.019) 1.161,-5.836 ; 2.052,-5.585 3.298,-4.339 ; 2.107,5.618 cw(c0,0) 4.848,3.535 ; 2.467,0.932 3.4,1.866 ; 2.467,1.866 3.4,0.932 ; 2.756,-0.891 3.689,0.042 ; 2.756,0.042 3.689,-0.891 ; 3.616,-6.285 ccw(c0,0) 6.285,-3.615 ; 4.873,3.5 cw(c0,0) 6,0 ; 5.585,-2.052 4.34,-3.298 ; 5.589,-2.041 ccw(c0.001,-0.001) 5.817,-1.255 ; 6.273,3.635 cw(c0,0) 7.25,-0.012 ; 7.35,-1.493 7.35,-3.747 cw(c0,0) 6.727,-4.777 0.774,-8.214 cw(c0,0) -0.773,-8.214 -6.726,-4.777 cw(c0,0) -7.65,-3.089 -7.65,3.088 cw(c0,0) -6.726,4.776 -0.773,8.213 cw(c0,0) 0.774,8.213 6.727,4.776 cw(c0,0) 7.35,3.747 7.35,-0.385 ; -5.429,-0.479 cw(c0,0) -4.339,3.297 ; -5.429,-0.479 ccw(c0,0) -3.853,-3.854 ; -4.339,3.297 -3.297,4.339 ; -3.853,-3.854 ccw(c0,0) -0.479,-5.429 ; -3.853,-3.854 -4.242,-4.243 ccw(c0,0) -0.971,-5.921 -0.479,-5.429 ; -3.297,4.339 cw(c0,0) -2.002,5.069 ; -2.002,5.069 cw(c0,0) 1.864,5.121 ; -2.002,5.069 -1.19,5.88 cw(c0,-0.002) 2.053,5.638 1.864,5.121 ; -0.6,4.106 cw(c0,0) 0.6,4.106 ; -0.6,4.106 ccw(c0,0) 0.6,4.106 ; -0.6,4.106 -0.6,3.55 ccw(c0,3.55) 0.6,3.55 0.6,4.106 ; -0.479,-5.429 ccw(c0,0) 3.298,-4.339 ; -0.003,-5.95 ccw(c0.001,-0.005) 1.161,-5.836 ; -0.003,-5.95 ccw(c-0.001,0.02) 1.161,-5.836 ; 1.864,5.121 cw(c0,0) 4.41,3.203 ; 3.298,-4.339 4.34,-3.298 ; 4.34,-3.298 ccw(c0,0) 5.069,-2.002 ; 4.41,3.203 cw(c0,0) 5.069,-2.002 ; 4.41,3.203 4.855,3.526 cw(c0.001,0) 5.881,-1.191 5.069,-2.002 ; -7.458,0.789 cw(c0,0) -6.853,3.046 -3.045,6.853 cw(c0,0) -0.789,7.458 4.413,6.064 cw(c0,0) 6.065,4.412 7.459,-0.789 cw(c0,0) 6.854,-3.046 3.046,-6.854 cw(c0,0) 0.789,-7.459 -4.412,-6.065 cw(c0,0) -6.064,-4.413 -7.458,0.789
M8 Top Brd Anno:
  circle w0.1: c0,0 r8.511
  lines w0.1: -0.5,0 0.5,0 ; 0,-0.5 0,0.5
3D body "1437119.stp": height 22.4, standoff -3.6, extent -11.503,-11.503 11.503,11.503

## 1775838-2_mini_pci-e [mm]
pads (56):
  rect 0.5x2.2 smd: 1(-11.8,-4.2)
  oval 0.5x2.2 smd: 2(-11.4,4.2) 3(-11,-4.2) 4(-10.6,4.2) 5(-10.2,-4.2) 6(-9.8,4.2) 7(-9.4,-4.2) 8(-9,4.2) 9(-8.6,-4.2) 10(-8.2,4.2) 11(-7.8,-4.2) 12(-7.4,4.2) 13(-7,-4.2) 14(-6.6,4.2) 15(-6.2,-4.2) 16(-5.8,4.2) 17(-2.2,-4.2) 18(-1.8,4.2) 19(-1.4,-4.2) 20(-1,4.2) 21(-0.6,-4.2) 22(-0.2,4.2) 23(0.2,-4.2) 24(0.6,4.2) 25(1,-4.2) 26(1.4,4.2) 27(1.8,-4.2) 28(2.2,4.2) 29(2.6,-4.2) 30(3,4.2) 31(3.4,-4.2) 32(3.8,4.2) 33(4.2,-4.2) 34(4.6,4.2) 35(5,-4.2) 36(5.4,4.2) 37(5.8,-4.2) 38(6.2,4.2) 39(6.6,-4.2) 40(7,4.2) 41(7.4,-4.2) 42(7.8,4.2) 43(8.2,-4.2) 44(8.6,4.2) 45(9,-4.2) 46(9.4,4.2) 47(9.8,-4.2) 48(10.2,4.2) 49(10.6,-4.2) 50(11,4.2) 51(11.4,-4.2) 52(11.8,4.2)
  rrect50% 2.3x3.2 smd: ""(-14.65,-3.5) ""(14.65,-3.5)
  round 1.6 hole 1.6: ""(-12.5,0)
  round 1.1 hole 1.1: ""(12.5,0)
Top Overlay:
  lines w0.2: -15.25,-1.5 -15.25,4.75 -12.25,4.75 ; -13,-3.5 -12.5,-3.5 ; -5.5,-3.5 -3,-3.5 ; -5,3.5 -2.5,3.5 ; 12.25,-3.5 13,-3.5 ; 12.5,4.75 15.25,4.75 15.25,-1.5
M3 Top Assy:
  drawing of 236 lines, arcs and shapes, not listed
M8 Top Brd Anno:
  lines w0.1: -0.5,0 0.5,0 ; 0,-0.5 0,0.5 ; -14.95,-4.55 14.95,-4.55 14.95,-1.45 14.95,4.5 -14.95,4.5 -14.95,-4.55
3D body "c-1775838-2-g-3d.stp": height 5.58, standoff -0.67, extent -14.95,-4.58 14.95,4.5

## 1775838-2_mini_pci-e_with_DIGI [mm]
pads (56):
  rect 0.5x2.2 smd: 1(-11.8,-4.2)
  oval 0.5x2.2 smd: 2(-11.4,4.2) 3(-11,-4.2) 4(-10.6,4.2) 5(-10.2,-4.2) 6(-9.8,4.2) 7(-9.4,-4.2) 8(-9,4.2) 9(-8.6,-4.2) 10(-8.2,4.2) 11(-7.8,-4.2) 12(-7.4,4.2) 13(-7,-4.2) 14(-6.6,4.2) 15(-6.2,-4.2) 16(-5.8,4.2) 17(-2.2,-4.2) 18(-1.8,4.2) 19(-1.4,-4.2) 20(-1,4.2) 21(-0.6,-4.2) 22(-0.2,4.2) 23(0.2,-4.2) 24(0.6,4.2) 25(1,-4.2) 26(1.4,4.2) 27(1.8,-4.2) 28(2.2,4.2) 29(2.6,-4.2) 30(3,4.2) 31(3.4,-4.2) 32(3.8,4.2) 33(4.2,-4.2) 34(4.6,4.2) 35(5,-4.2) 36(5.4,4.2) 37(5.8,-4.2) 38(6.2,4.2) 39(6.6,-4.2) 40(7,4.2) 41(7.4,-4.2) 42(7.8,4.2) 43(8.2,-4.2) 44(8.6,4.2) 45(9,-4.2) 46(9.4,4.2) 47(9.8,-4.2) 48(10.2,4.2) 49(10.6,-4.2) 50(11,4.2) 51(11.4,-4.2) 52(11.8,4.2)
  rrect50% 2.3x3.2 smd: ""(-14.65,-3.5) ""(14.65,-3.5)
  round 1.6 hole 1.6: ""(-12.5,0)
  round 1.1 hole 1.1: ""(12.5,0)
Top Overlay:
  lines w0.2: -15.25,-1.5 -15.25,4.75 -12.25,4.75 ; -13,-3.5 -12.5,-3.5 ; -5.5,-3.5 -3,-3.5 ; -5,3.5 -2.5,3.5 ; 12.25,-3.5 13,-3.5 ; 12.5,4.75 15.25,4.75 15.25,-1.5
M3 Top Assy:
  drawing of 236 lines, arcs and shapes, not listed
M8 Top Brd Anno:
  lines w0.1: -0.5,0 0.5,0 ; 0,-0.5 0,0.5 ; -14.95,-4.55 -14.95,4.5 14.95,4.5 14.95,-1.45 14.95,-4.55 -14.95,-4.55
3D body "digi.STEP": height 7.09, standoff -0.65, extent -17,-4.6 17,50.93